# Altium footprint library ACTION_IC.PcbLib: 135 footprints (part 4 of 9)
Each footprint in its own frame and in the unit in brackets; x right, y up, seen from the top. Pads: shape width x height; smd on the part's side, far side on the other; paste and mask are expansions set on the pad; w line width, h text height; cw(c..) or ccw(c..) is an arc to the next point about the centre after c.
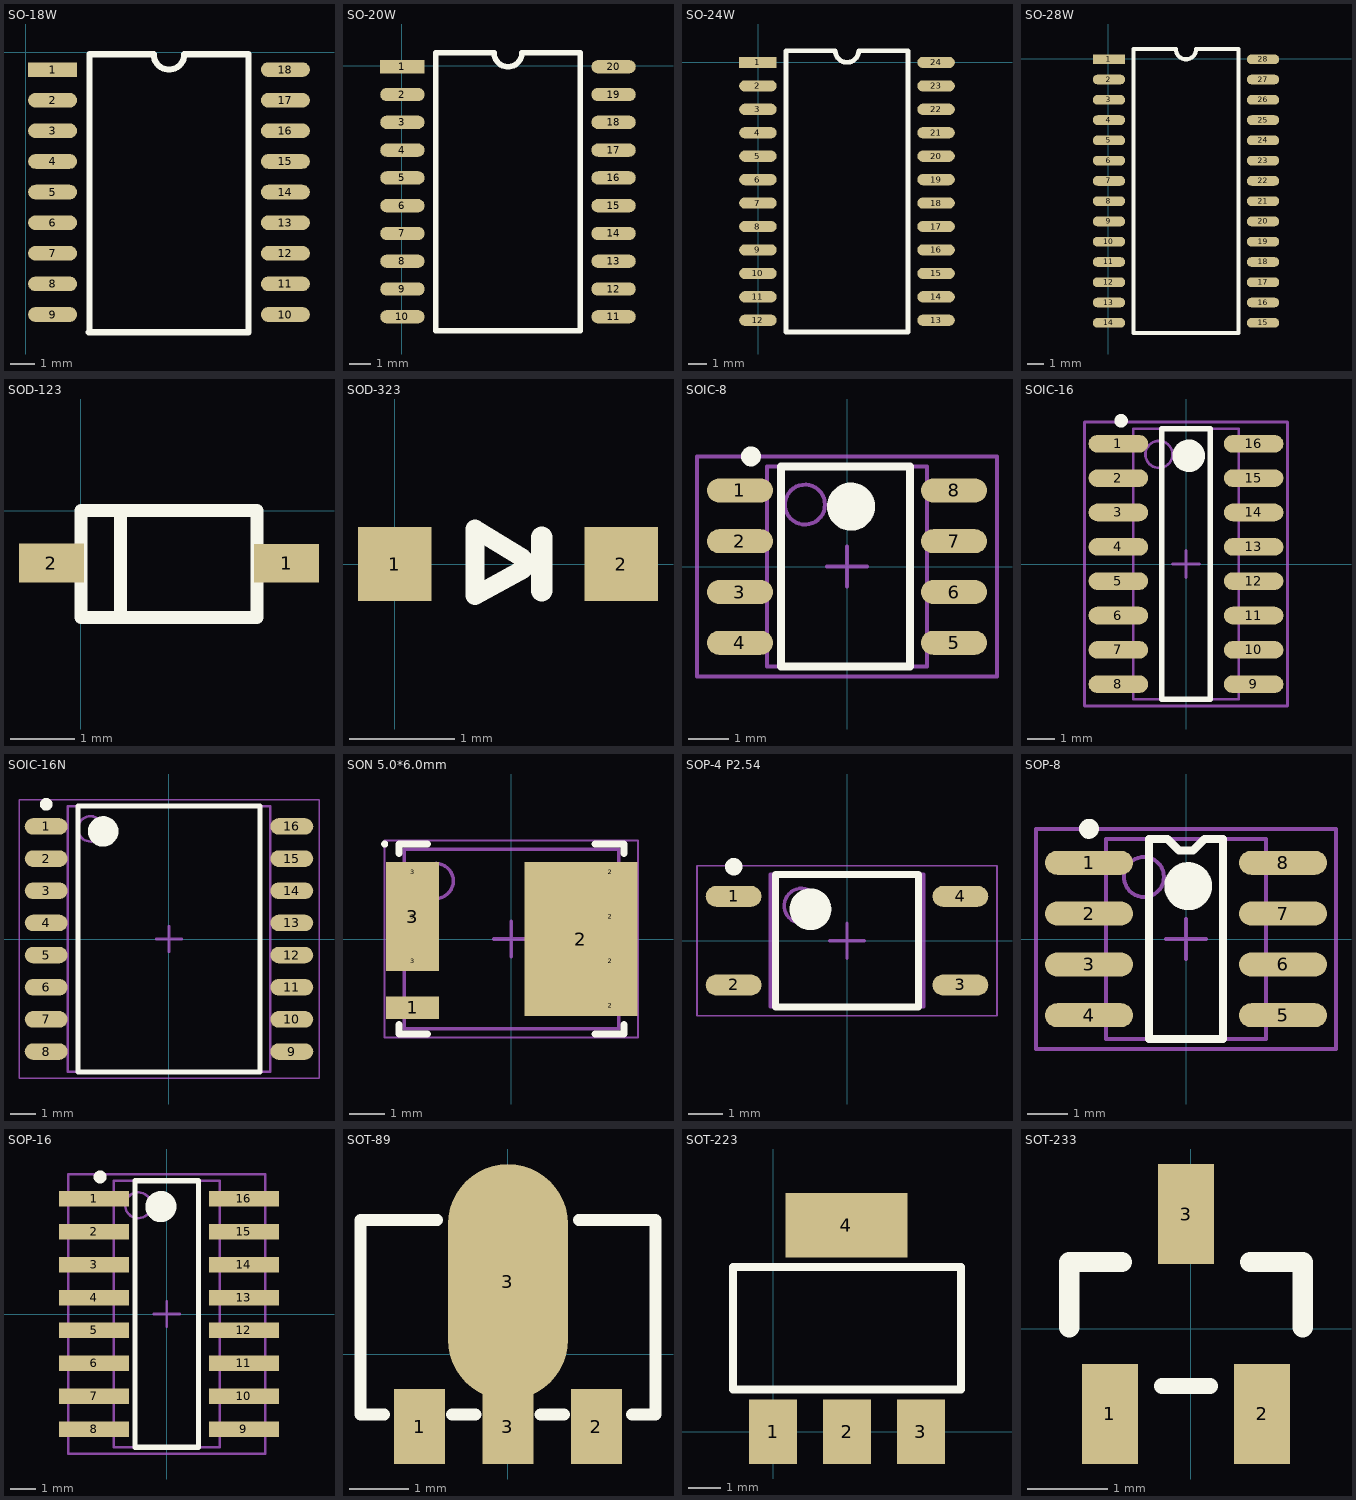
[diagram p3: the footprints below, top view; thin cyan lines are the x and y axes]

## SO-18W [mil]
pads (18):
  rect 80x24 smd: 1(44,-28)
  oval 80x24 smd: 2(44,-78) 3(44,-128) 4(44,-178) 5(44,-228) 6(44,-278) 7(44,-328) 8(44,-378) 9(44,-428) 10(424,-428) 11(424,-378) 12(424,-328) 13(424,-278) 14(424,-228) 15(424,-178) 16(424,-128) 17(424,-78) 18(424,-28)
Top Overlay:
  lines w10: 103,-457 363,-457 ; 104,-457 104,-3 209,-3 ccw(c234,-3) 259,-3 364,-3 364,-457
3D body "User Library-SO-18W.STEP": height 97.64, standoff 0, extent 34.05,-451.95 439.96,3.95

## SO-20W [mil]
pads (20):
  rect 80x24 smd: 1(1,-2)
  oval 80x24 smd: 2(1,-52) 3(1,-102) 4(1,-152) 5(1,-202) 6(1,-252) 7(1,-302) 8(1,-352) 9(1,-402) 10(1,-452) 11(381,-452) 12(381,-402) 13(381,-352) 14(381,-302) 15(381,-252) 16(381,-202) 17(381,-152) 18(381,-102) 19(381,-52) 20(381,-2)
Top Overlay:
  lines w10: 61,-477 321,-477 321,23 216,23 cw(c191,23) 166,23 61,23 61,-477
3D body "User Library-SO-20W.STEP": height 97.64, standoff 0, extent -9.95,-480.37 395.96,24.36

## SO-24W [mil]
pads (24):
  rect 80x24 smd: 1(-1,0)
  oval 80x24 smd: 2(-1,-50) 3(-1,-100) 4(-1,-150) 5(-1,-200) 6(-1,-250) 7(-1,-300) 8(-1,-350) 9(-1,-400) 10(-1,-450) 11(-1,-500) 12(-1,-550) 13(379,-550) 14(379,-500) 15(379,-450) 16(379,-400) 17(379,-350) 18(379,-300) 19(379,-250) 20(379,-200) 21(379,-150) 22(379,-100) 23(379,-50) 24(379,0)
Top Overlay:
  lines w10: 59,-575 59,25 164,25 ccw(c189,25) 214,25 319,25 319,-575 59,-575
3D body "User Library-SO-24W.STEP": height 97.64, standoff 0, extent -32.95,-577.69 372.95,29

## SO-28W [mil]
pads (28):
  rect 80x24 smd: 1(2,-1)
  oval 80x24 smd: 2(2,-51) 3(2,-101) 4(2,-151) 5(2,-201) 6(2,-251) 7(2,-301) 8(2,-351) 9(2,-401) 10(2,-451) 11(2,-501) 12(2,-551) 13(2,-601) 14(2,-651) 15(382,-651) 16(382,-601) 17(382,-551) 18(382,-501) 19(382,-451) 20(382,-401) 21(382,-351) 22(382,-301) 23(382,-251) 24(382,-201) 25(382,-151) 26(382,-101) 27(382,-51) 28(382,-1)
Top Overlay:
  lines w10: 62,-676 62,24 167,24 ccw(c192,24) 217,24 322,24 322,-676 62,-676
3D body "SOIC28.STEP": height 104.33, standoff 0, extent -17.76,-677 387.76,27.72

## SOD-123 [mm]
pads (2):
  rect 1x0.6 smd: 1(3.175,-0.813) 2(-0.457,-0.813)
Top Overlay:
  lines w0.198: 0.61,-1.6 0.61,-0.025 ; 2.7,0 0,0 0,-1.65 2.717,-1.65 2.718,-1.651 2.718,0
3D body "SOD123.STEP": height 1.27, standoff 0, extent -0.427,-1.587 3.273,0.013

## SOD-323 [mm]
pads (2):
  rect 0.7x0.7 smd: 1(0,0) 2(2.15,0)
Top Overlay:
  lines w0.178: 1.221,-0.05 0.762,-0.3 0.762,0.332 1.221,0.05
  lines w0.203: 1.397,-0.254 1.397,0.254
3D body: height 1.5, standoff 0, extent 0,-0.584 2.108,0.559

## SOIC-8 [mm] "SOIC, 8-Leads, Body 5.0x4.0mm (max), Pitch 1.27mm, IPC Medium Density"
height 1.75
pads (8):
  oval 1.65x0.6 smd: 1(-2.675,1.905) 2(-2.675,0.635) 3(-2.675,-0.635) 4(-2.675,-1.905) 5(2.675,-1.905) 6(2.675,-0.635) 7(2.675,0.635) 8(2.675,1.905)
Top Overlay:
  circle w0.25: c-2.4,2.755 r0.125
  circle w0.6: c0.1,1.5 r0.3
  lines w0.2: -1.651,-2.5 -1.651,2.5 1.575,2.5 1.575,-2.5 -1.651,-2.5
Mechanical 13:
  circle w0.1: c-1.05,1.55 r0.5
  lines w0.1: -2,-2.5 -2,2.5 2,2.5 2,-2.5 -2,-2.5
Mechanical 15:
  lines w0.1: -0.5,0 0.5,0 ; 0,-0.5 0,0.5 ; -3.75,-2.75 -3.75,2.75 3.75,2.75 3.75,-2.75 -3.75,-2.75
3D body "SOIC8.STEP": height 1.6, standoff 0, extent -2.995,-2.535 3.046,2.485

## SOIC-16 [mm] "SOIC, 16-Leads, Body 10.0x3.9mm (max), Pitch 1.27mm, IPC Medium Density"
height 1.5
pads (16):
  oval 2.2x0.65 smd: 1(-2.502,4.445) 2(-2.502,3.175) 3(-2.502,1.905) 4(-2.502,0.635) 5(-2.502,-0.635) 6(-2.502,-1.905) 7(-2.502,-3.175) 8(-2.502,-4.445) 9(2.502,-4.445) 10(2.502,-3.175) 11(2.502,-1.905) 12(2.502,-0.635) 13(2.502,0.635) 14(2.502,1.905) 15(2.502,3.175) 16(2.502,4.445)
Top Overlay:
  circle w0.6: c0.1,4 r0.3
  circle w0.25: c-2.4,5.295 r0.125
  lines w0.2: -0.9,-5 0.9,-5 0.9,5 -0.9,5 -0.9,-5
Mechanical 13:
  circle w0.1: c-1,4.05 r0.5
  lines w0.1: -1.95,-5 1.95,-5 1.95,5 -1.95,5 -1.95,-5
Mechanical 15:
  lines w0.1: -0.5,0 0.5,0 ; 0,-0.5 0,0.5 ; -3.75,-5.25 3.75,-5.25 3.75,5.25 -3.75,5.25 -3.75,-5.25
3D body "SOIC16.STEP": height 1.95, standoff 0, extent -3.053,-5.201 3.003,5.099

## SOIC-16N [mm]
pads (16):
  oval 1.7x0.65 smd: 1(-4.85,4.445) 2(-4.85,3.175) 3(-4.85,1.905) 4(-4.85,0.635) 5(-4.85,-0.635) 6(-4.85,-1.905) 7(-4.85,-3.175) 8(-4.85,-4.445) 9(4.85,-4.445) 10(4.85,-3.175) 11(4.85,-1.905) 12(4.85,-0.635) 13(4.85,0.635) 14(4.85,1.905) 15(4.85,3.175) 16(4.85,4.445)
Top Overlay:
  circle w0.25: c-4.85,5.32 r0.125
  circle w0.6: c-2.6,4.25 r0.3
  lines w0.2: -3.6,-5.25 -3.6,5.25 3.6,5.25 3.6,-5.25 -3.6,-5.25
Mechanical 13:
  circle w0.1: c-3.1,4.35 r0.5
  lines w0.1: -4,-5.25 -4,5.25 4,5.25 4,-5.25 -4,-5.25
Mechanical 15:
  lines w0.05: -5.925,-5.5 -5.925,5.5 5.925,5.5 5.925,-5.5 -5.925,-5.5
  lines w0.1: -0.5,0 0.5,0 ; 0,-0.5 0,0.5
3D body "SOIC127P1050X358-16N.step": height 3.58, standoff 0, extent -5.26,-5.25 5.26,5.25

## SON 5.0*6.0mm [mm]
height 0.8
pads (10):
  rect 1.5x0.65 smd: 1(-2.81,-1.956)
  rect 3.2x4.38 smd: 2(1.981,0)
  rect 1.05x0.25 smd: 2(2.81,-1.905) 2(2.81,-0.635) 2(2.81,0.635) 2(2.81,1.905) 3(-2.81,-0.635) 3(-2.81,0.635) 3(-2.81,1.905)
  rect 1.5x3.1 smd: 3(-2.81,0.635)
Top Overlay:
  circle w0.1: c-3.6,2.7 r0.05
  lines w0.2: -3.2,-2.43 -3.2,-2.7 -2.385,-2.7 ; -3.2,2.43 -3.2,2.7 -2.385,2.7 ; 2.385,-2.7 3.2,-2.7 3.2,-2.43 ; 2.385,2.7 3.2,2.7 3.2,2.43
Mechanical 13:
  circle w0.1: c-2.15,1.65 r0.5
  lines w0.1: -3.05,-2.55 3.05,-2.55 3.05,2.55 -3.05,2.55 -3.05,-2.55
Mechanical 15:
  lines w0.05: -3.605,-2.8 3.605,-2.8 3.605,2.8 -3.605,2.8 -3.605,-2.8
  lines w0.1: -0.5,0 0.5,0 ; 0,-0.5 0,0.5
3D body: height 0.8, standoff 0.15, extent -3.05,-2.55 3.05,2.55

## SOP-4 P2.54 [mm]
height 2.5
pads (4):
  oval 1.6x0.6 smd: 1(-3.25,1.27) 2(-3.25,-1.27) 3(3.25,-1.27) 4(3.25,1.27)
Top Overlay:
  circle w0.6: c-1.05,0.9 r0.3
  circle w0.25: c-3.25,2.12 r0.125
  lines w0.2: -2.05,-1.9 2.05,-1.9 2.05,1.9 -2.05,1.9 -2.05,-1.9
Mechanical 13:
  circle w0.1: c-1.3,1 r0.5
  lines w0.1: -2.2,-1.9 2.2,-1.9 2.2,1.9 -2.2,1.9 -2.2,-1.9
Mechanical 15:
  lines w0.05: -4.3,-2.15 4.3,-2.15 4.3,2.15 -4.3,2.15 -4.3,-2.15
  lines w0.1: -0.5,0 0.5,0 ; 0,-0.5 0,0.5
3D body: height 2.5, standoff 0.1, extent -2.2,-1.9 2.2,1.9

## SOP-8 [mm] "SOP, 8-Leads, Body 5.0x4.0mm (max), Pitch 1.27mm, IPC Medium Density"
height 1.75
pads (8):
  oval 2.2x0.6 smd: 1(-2.425,1.905) 2(-2.425,0.635) 3(-2.425,-0.635) 4(-2.425,-1.905) 5(2.425,-1.905) 6(2.425,-0.635) 7(2.425,0.635) 8(2.425,1.905)
Top Overlay:
  circle w0.25: c-2.425,2.755 r0.125
  circle w0.6: c0.056,1.321 r0.3
  lines w0.2: -0.925,-2.5 -0.925,2.5 -0.462,2.5 -0.172,2.21 0.172,2.21 0.463,2.5 0.925,2.5 0.925,-2.5 -0.925,-2.5
Mechanical 13:
  circle w0.1: c-1.05,1.55 r0.5
  lines w0.1: -2,-2.5 -2,2.5 2,2.5 2,-2.5 -2,-2.5
Mechanical 15:
  lines w0.1: -0.5,0 0.5,0 ; 0,-0.5 0,0.5 ; -3.75,-2.75 -3.75,2.75 3.75,2.75 3.75,-2.75 -3.75,-2.75
3D body "User Library-sop-8.STEP": height 1.6, standoff 0, extent -2.894,-2.485 3.148,2.535

## SOP-16 [mm] "SOP, 16-Leads, Body 10.3x4.1mm (max), Pitch 1.27mm, IPC Medium Density"
height 1.8
pads (16):
  rect 2.7x0.6 smd: 1(-2.804,4.445) 2(-2.804,3.175) 3(-2.804,1.905) 4(-2.804,0.635) 5(-2.804,-0.635) 6(-2.804,-1.905) 7(-2.804,-3.175) 8(-2.804,-4.445) 9(2.981,-4.445) 10(2.981,-3.175) 11(2.981,-1.905) 12(2.981,-0.635) 13(2.981,0.635) 14(2.981,1.905) 15(2.981,3.175) 16(2.981,4.445)
Top Overlay:
  circle w0.6: c-0.225,4.15 r0.3
  circle w0.25: c-2.575,5.295 r0.125
  lines w0.2: -1.225,-5.15 1.225,-5.15 1.225,5.15 -1.225,5.15 -1.225,-5.15
Mechanical 13:
  circle w0.1: c-1.1,4.2 r0.5
  lines w0.1: -2.05,-5.15 2.05,-5.15 2.05,5.15 -2.05,5.15 -2.05,-5.15
Mechanical 15:
  lines w0.1: -0.5,0 0.5,0 ; 0,-0.5 0,0.5 ; -3.8,-5.4 3.8,-5.4 3.8,5.4 -3.8,5.4 -3.8,-5.4
3D body "User Library-User Library-TLP291-4(SOP16).STEP": height 2.1, standoff 0, extent -3.195,-5.201 3.805,5.099

## SOT-89 [mil]
pads (4):
  rect 34x50 smd: 1(-59.05,-48.27) 2(59.05,-48.27) 3(0,-48.27)
  oval 80x157.48 smd: 3(0,48.27)
Top Overlay:
  lines w7.87: -82.68,-40.31 -98.42,-40.31 -98.42,89.61 -47.24,89.61 ; 47.24,89.61 98.43,89.61 98.43,-40.31
  lines w8: -37.4,-40.31 -21.65,-40.31 ; 21.65,-40.31 37.4,-40.31 ; 82.68,-40.31 98.43,-40.31
3D body "SOT-89.STEP": height 59.45, standoff 0, extent -87.4,-59.45 89.76,109.84

## SOT-223 [mil]
pads (4):
  rect 59x79 smd: 1(0,0) 2(90.55,0) 3(181.1,0)
  rect 150x79 smd: 4(89.88,253.54)
Top Overlay:
  lines w10: -49.45,52 230.55,52 230.55,202 -49.45,202 -49.45,52
3D body "SOT223.STEP": height 65.04, standoff 0.08, extent -41.95,-11.79 213.96,263.8

## SOT-233 [mm]
pads (3):
  rect 0.7x1.25 smd: 1(-1.011,-1.067) 2(0.889,-1.067) 3(-0.061,1.433)
Top Overlay:
  lines w0.2: -0.361,-0.717 0.239,-0.717
  lines w0.254: -1.521,0.018 -1.521,0.833 -0.861,0.833 ; 1.399,0.018 1.399,0.833 ; 0.739,0.833 1.399,0.833 ; 0.739,0.833 1.399,0.833 ; 0.739,0.833 1.399,0.833
3D body "SOT-23A.STEP": height 1.2, standoff 0, extent -1.513,-1.29 1.387,1.51